# Altium integrated library Samtec_2,54_mm_Pitch_Socket_Strips.IntLib: 489 symbols (part 1 of 4)
Pins are listed as number, name and electrical type; pins without a type are passive.

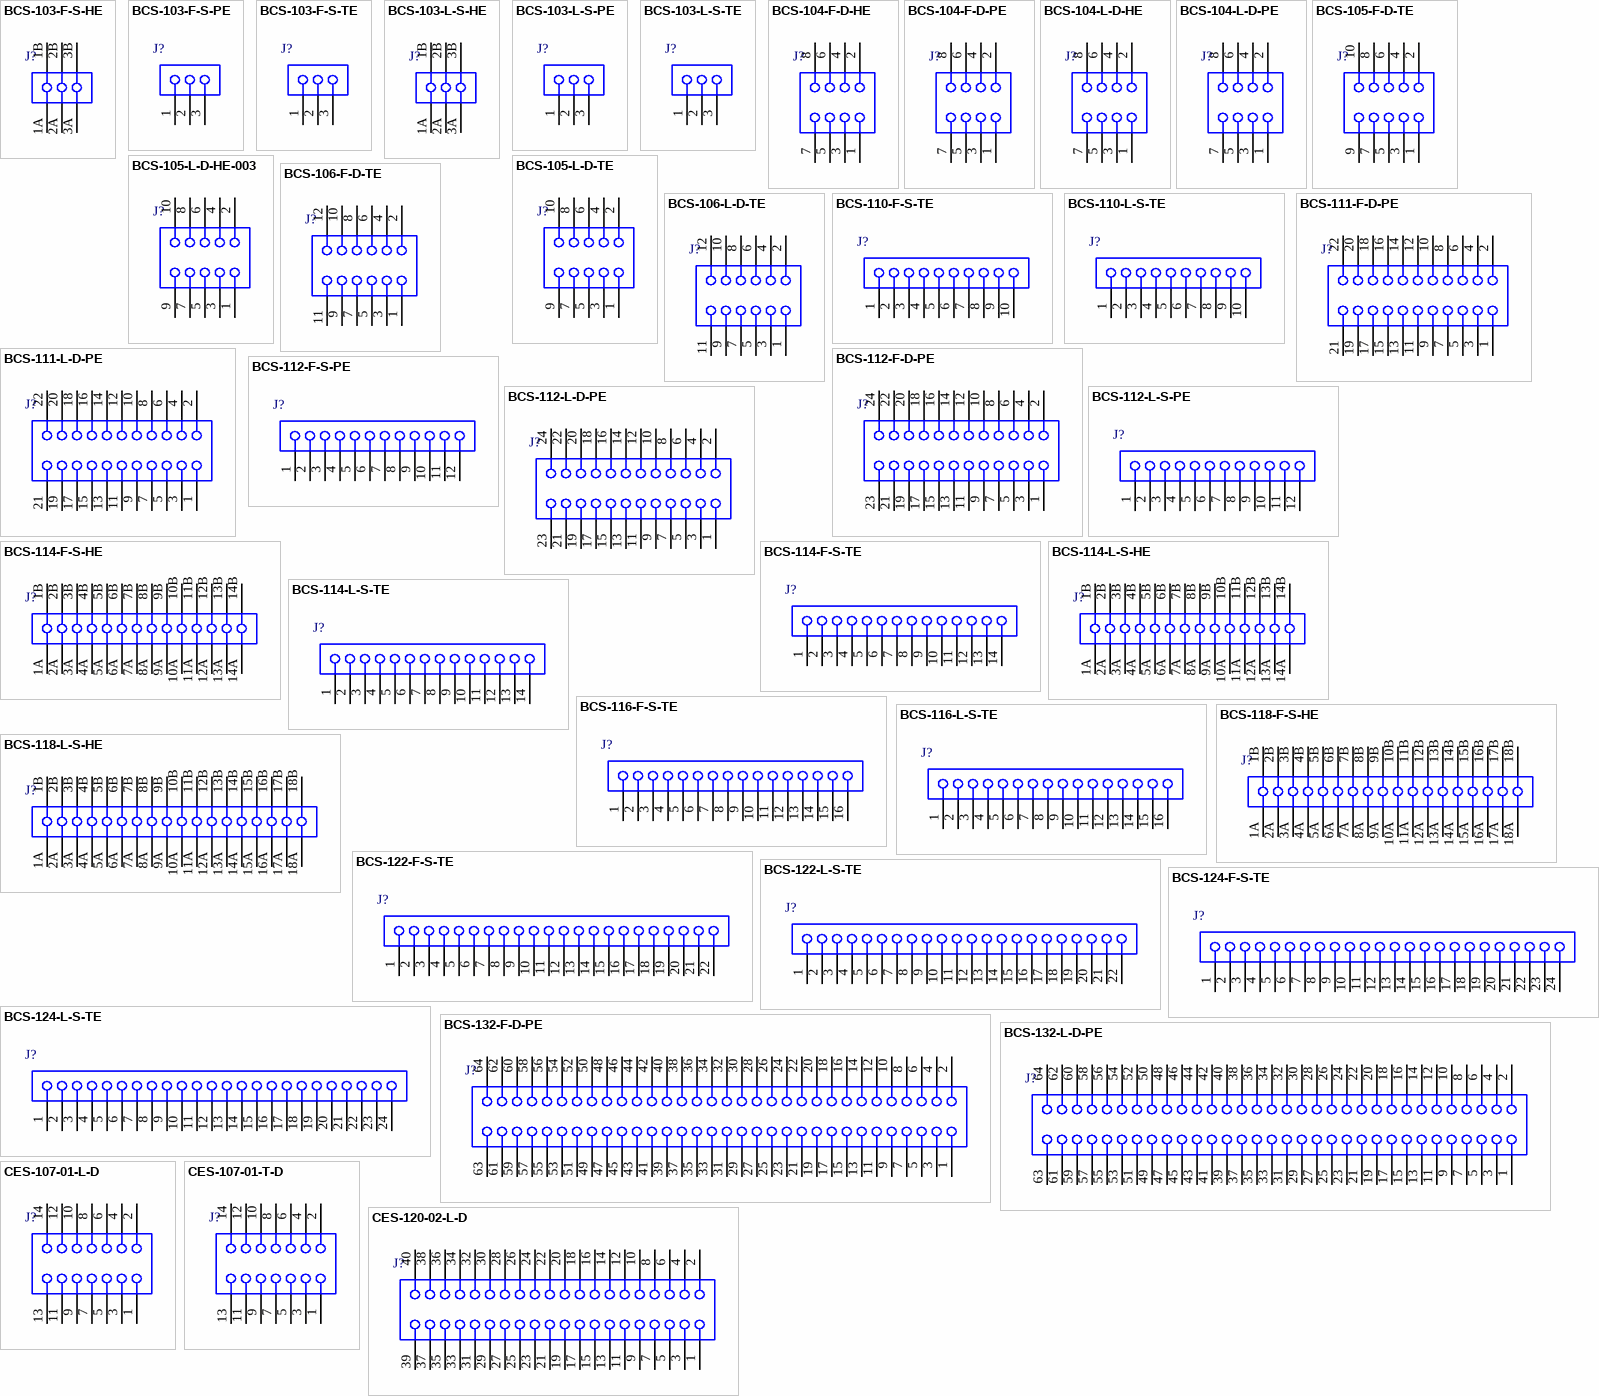
[diagram p0: symbols BCS-103-F-S-HE to CES-120-02-L-D]

## BCS-103-F-S-HE
designator J?
Tiger Claw(TM) Pass-Through Socket, Horizontal, -55 to 125 degC, 2.54 mm Pitch, 6-Pin, Female, RoHS; Manufacturer: Samtec; PartNumber: BCS-103-F-S-HE; Pitch: 2.54 mm; DatasheetVersion: F-214; PackageVersion: BV, 9/1991; PackageReference: BCS-103-X-S-HE; PackageDescription: Box Connector Socket Strip; Orientation: Horizontal; RoHS: True; Temperature Range: -55 to 125 degC; Mounting Technology: Through-hole; ComponentLink1Description: Manufacturer URL; ComponentLink1URL: http://www.samtec.com; ComponentLink2Description: Datasheet; ComponentLink2URL: http://www.samtec.com/documents/webfiles/pdf/BCS.PDF; ComponentLink3Description: Package Specification; ComponentLink3URL: http://www.samtec.com/documents/webfiles/cpdf/BCS-1XX-XXX-X-XX-XXX-MKT.pdf
footprint SMTC-BCS-103-X-S-HE (Box Connector Socket Strip, 2x3 Pins, Horizontal, 2.54mm Pitch, Female)
pins: 1A, 1B, 2A, 2B, 3A, 3B

## BCS-103-F-S-PE
designator J?
Tiger Claw(TM) Pass-Through Socket, Vertical, -55 to 125 degC, 2.54 mm Pitch, 3-Pin, Female, RoHS; Manufacturer: Samtec; PartNumber: BCS-103-F-S-PE; Pitch: 2.54 mm; DatasheetVersion: F-214; PackageVersion: BV, 9/1991; PackageReference: BCS-103-X-S-PE; PackageDescription: Box Connector Socket Strip; Orientation: Vertical; RoHS: True; Temperature Range: -55 to 125 degC; Mounting Technology: Through-hole; ComponentLink1Description: Manufacturer URL; ComponentLink1URL: http://www.samtec.com; ComponentLink2Description: Datasheet; ComponentLink2URL: http://www.samtec.com/documents/webfiles/pdf/BCS.PDF; ComponentLink3Description: Package Specification; ComponentLink3URL: http://www.samtec.com/documents/webfiles/cpdf/BCS-1XX-XXX-X-XX-XXX-MKT.pdf
footprint SMTC-BCS-103-X-S-PE (Box Connector Socket Strip, 3 Pins, Vertical, 2.54mm Pitch, Female)
pins: 1, 2, 3

## BCS-103-F-S-TE
designator J?
Tiger Claw(TM) Pass-Through Socket, Vertical, -55 to 125 degC, 2.54 mm Pitch, 3-Pin, Female, RoHS; Manufacturer: Samtec; PartNumber: BCS-103-F-S-TE; Pitch: 2.54 mm; DatasheetVersion: F-214; PackageVersion: BV, 9/1991; PackageReference: BCS-103-X-S-TE; PackageDescription: Box Connector Socket Strip; Orientation: Vertical; RoHS: True; Temperature Range: -55 to 125 degC; Mounting Technology: Through-hole; ComponentLink1Description: Manufacturer URL; ComponentLink1URL: http://www.samtec.com; ComponentLink2Description: Datasheet; ComponentLink2URL: http://www.samtec.com/documents/webfiles/pdf/BCS.PDF; ComponentLink3Description: Package Specification; ComponentLink3URL: http://www.samtec.com/documents/webfiles/cpdf/BCS-1XX-XXX-X-XX-XXX-MKT.pdf
footprint SMTC-BCS-103-X-S-TE (Box Connector Socket Strip, 1x3 Pins, Vertical, 2.54mm Pitch, Female)
pins: 1, 2, 3

## BCS-103-L-S-HE
designator J?
Tiger Claw(TM) Pass-Through Socket, Horizontal, -55 to 125 degC, 2.54 mm Pitch, 6-Pin, Female, RoHS; Manufacturer: Samtec; PartNumber: BCS-103-L-S-HE; Pitch: 2.54 mm; DatasheetVersion: F-214; PackageVersion: BV, 9/1991; PackageReference: BCS-103-X-S-HE; PackageDescription: Box Connector Socket Strip; Supplier 1: Digi-Key; Supplier Part Number 1: SAM1009-03-ND; Supplier 2: Newark; Supplier Part Number 2: 11P3211; Orientation: Horizontal; RoHS: True; Temperature Range: -55 to 125 degC; Mounting Technology: Through-hole; ComponentLink1Description: Manufacturer URL; ComponentLink1URL: http://www.samtec.com; ComponentLink2Description: Datasheet; ComponentLink2URL: http://www.samtec.com/documents/webfiles/pdf/BCS.PDF; ComponentLink3Description: Package Specification; ComponentLink3URL: http://www.samtec.com/documents/webfiles/cpdf/BCS-1XX-XXX-X-XX-XXX-MKT.pdf
footprint SMTC-BCS-103-X-S-HE (Box Connector Socket Strip, 2x3 Pins, Horizontal, 2.54mm Pitch, Female)
pins: 1A, 1B, 2A, 2B, 3A, 3B

## BCS-103-L-S-PE
designator J?
Tiger Claw(TM) Pass-Through Socket, Vertical, -55 to 125 degC, 2.54 mm Pitch, 3-Pin, Female, RoHS; Manufacturer: Samtec; PartNumber: BCS-103-L-S-PE; Pitch: 2.54 mm; DatasheetVersion: F-214; PackageVersion: BV, 9/1991; PackageReference: BCS-103-X-S-PE; PackageDescription: Box Connector Socket Strip; Supplier 1: Digi-Key; Supplier Part Number 1: SAM1010-03-ND; Supplier 2: Newark; Supplier Part Number 2: 11P3212; Orientation: Vertical; RoHS: True; Temperature Range: -55 to 125 degC; Mounting Technology: Through-hole; ComponentLink1Description: Manufacturer URL; ComponentLink1URL: http://www.samtec.com; ComponentLink2Description: Datasheet; ComponentLink2URL: http://www.samtec.com/documents/webfiles/pdf/BCS.PDF; ComponentLink3Description: Package Specification; ComponentLink3URL: http://www.samtec.com/documents/webfiles/cpdf/BCS-1XX-XXX-X-XX-XXX-MKT.pdf
footprint SMTC-BCS-103-X-S-PE (Box Connector Socket Strip, 3 Pins, Vertical, 2.54mm Pitch, Female)
pins: 1, 2, 3

## BCS-103-L-S-TE
designator J?
Tiger Claw(TM) Pass-Through Socket, Vertical, -55 to 125 degC, 2.54 mm Pitch, 3-Pin, Female, RoHS; Manufacturer: Samtec; PartNumber: BCS-103-L-S-TE; Pitch: 2.54 mm; DatasheetVersion: F-214; PackageVersion: BV, 9/1991; PackageReference: BCS-103-X-S-TE; PackageDescription: Box Connector Socket Strip; Supplier 1: Digi-Key; Supplier Part Number 1: SAM1011-03-ND; Supplier 2: Newark; Supplier Part Number 2: 11P3213; Orientation: Vertical; RoHS: True; Temperature Range: -55 to 125 degC; Mounting Technology: Through-hole; ComponentLink1Description: Manufacturer URL; ComponentLink1URL: http://www.samtec.com; ComponentLink2Description: Datasheet; ComponentLink2URL: http://www.samtec.com/documents/webfiles/pdf/BCS.PDF; ComponentLink3Description: Package Specification; ComponentLink3URL: http://www.samtec.com/documents/webfiles/cpdf/BCS-1XX-XXX-X-XX-XXX-MKT.pdf
footprint SMTC-BCS-103-X-S-TE (Box Connector Socket Strip, 1x3 Pins, Vertical, 2.54mm Pitch, Female)
pins: 1, 2, 3

## BCS-104-F-D-HE
designator J?
Tiger Claw(TM) Pass-Through Socket, Horizontal, -55 to 125 degC, 2.54 mm Pitch, 8-Pin, Female, RoHS; Manufacturer: Samtec; PartNumber: BCS-104-F-D-HE; Pitch: 2.54 mm; DatasheetVersion: F-214; PackageVersion: BV, 9/1991; PackageReference: BCS-104-X-D-HE; PackageDescription: Box Connector Socket Strip; Supplier 1: Newark; Supplier Part Number 1: 87P1759; Orientation: Horizontal; RoHS: True; Temperature Range: -55 to 125 degC; Mounting Technology: Through-hole; ComponentLink1Description: Manufacturer URL; ComponentLink1URL: http://www.samtec.com; ComponentLink2Description: Datasheet; ComponentLink2URL: http://www.samtec.com/documents/webfiles/pdf/BCS.PDF; ComponentLink3Description: Package Specification; ComponentLink3URL: http://www.samtec.com/documents/webfiles/cpdf/BCS-1XX-XXX-X-XX-XXX-MKT.pdf
footprint SMTC-BCS-104-X-D-HE (Box Connector Socket Strip, 2x4 Pins, Horizontal, 2.54mm Pitch, Female)
pins: 1, 2, 3, 4, 5, 6, 7, 8

## BCS-104-F-D-PE
designator J?
Tiger Claw(TM) Pass-Through Socket, Vertical, -55 to 125 degC, 2.54 mm Pitch, 8-Pin, Female, RoHS; Manufacturer: Samtec; PartNumber: BCS-104-F-D-PE; Pitch: 2.54 mm; DatasheetVersion: F-214; PackageVersion: BV, 9/1991; PackageReference: BCS-104-X-D-PE; PackageDescription: Box Connector Socket Strip; Supplier 1: Newark; Supplier Part Number 1: 87P1760; Orientation: Vertical; RoHS: True; Temperature Range: -55 to 125 degC; Mounting Technology: Through-hole; ComponentLink1Description: Manufacturer URL; ComponentLink1URL: http://www.samtec.com; ComponentLink2Description: Datasheet; ComponentLink2URL: http://www.samtec.com/documents/webfiles/pdf/BCS.PDF; ComponentLink3Description: Package Specification; ComponentLink3URL: http://www.samtec.com/documents/webfiles/cpdf/BCS-1XX-XXX-X-XX-XXX-MKT.pdf
footprint SMTC-BCS-104-X-D-PE (Box Connector Socket Strip, 2x4 Pins, Vertical, 2.54mm Pitch, Female)
pins: 1, 2, 3, 4, 5, 6, 7, 8

## BCS-104-L-D-HE
designator J?
Tiger Claw(TM) Pass-Through Socket, Horizontal, -55 to 125 degC, 2.54 mm Pitch, 8-Pin, Female, RoHS; Manufacturer: Samtec; PartNumber: BCS-104-L-D-HE; Pitch: 2.54 mm; DatasheetVersion: F-214; PackageVersion: BV, 9/1991; PackageReference: BCS-104-X-D-HE; PackageDescription: Box Connector Socket Strip; Supplier 1: Digi-Key; Supplier Part Number 1: SAM1006-04-ND; Supplier 2: Newark; Supplier Part Number 2: 11P3214; Orientation: Horizontal; RoHS: True; Temperature Range: -55 to 125 degC; Mounting Technology: Through-hole; ComponentLink1Description: Manufacturer URL; ComponentLink1URL: http://www.samtec.com; ComponentLink2Description: Datasheet; ComponentLink2URL: http://www.samtec.com/documents/webfiles/pdf/BCS.PDF; ComponentLink3Description: Package Specification; ComponentLink3URL: http://www.samtec.com/documents/webfiles/cpdf/BCS-1XX-XXX-X-XX-XXX-MKT.pdf
footprint SMTC-BCS-104-X-D-HE (Box Connector Socket Strip, 2x4 Pins, Horizontal, 2.54mm Pitch, Female)
pins: 1, 2, 3, 4, 5, 6, 7, 8

## BCS-104-L-D-PE
designator J?
Tiger Claw(TM) Pass-Through Socket, Vertical, -55 to 125 degC, 2.54 mm Pitch, 8-Pin, Female, RoHS; Manufacturer: Samtec; PartNumber: BCS-104-L-D-PE; Pitch: 2.54 mm; DatasheetVersion: F-214; PackageVersion: BV, 9/1991; PackageReference: BCS-104-X-D-PE; PackageDescription: Box Connector Socket Strip; Supplier 1: Digi-Key; Supplier Part Number 1: SAM1007-04-ND; Supplier 2: Newark; Supplier Part Number 2: 11P3215; Orientation: Vertical; RoHS: True; Temperature Range: -55 to 125 degC; Mounting Technology: Through-hole; ComponentLink1Description: Manufacturer URL; ComponentLink1URL: http://www.samtec.com; ComponentLink2Description: Datasheet; ComponentLink2URL: http://www.samtec.com/documents/webfiles/pdf/BCS.PDF; ComponentLink3Description: Package Specification; ComponentLink3URL: http://www.samtec.com/documents/webfiles/cpdf/BCS-1XX-XXX-X-XX-XXX-MKT.pdf
footprint SMTC-BCS-104-X-D-PE (Box Connector Socket Strip, 2x4 Pins, Vertical, 2.54mm Pitch, Female)
pins: 1, 2, 3, 4, 5, 6, 7, 8

## BCS-105-F-D-TE
designator J?
Tiger Claw(TM) Pass-Through Socket, Vertical, -55 to 125 degC, 2.54 mm Pitch, 10-Pin, Female, RoHS; Manufacturer: Samtec; PartNumber: BCS-105-F-D-TE; Pitch: 2.54 mm; DatasheetVersion: F-214; PackageVersion: BV, 9/1991; PackageReference: BCS-105-X-D-TE; PackageDescription: Box Connector Socket Strip; Supplier 1: Newark; Supplier Part Number 1: 87P1818; Orientation: Vertical; RoHS: True; Temperature Range: -55 to 125 degC; Mounting Technology: Through-hole; ComponentLink1Description: Manufacturer URL; ComponentLink1URL: http://www.samtec.com; ComponentLink2Description: Datasheet; ComponentLink2URL: http://www.samtec.com/documents/webfiles/pdf/BCS.PDF; ComponentLink3Description: Package Specification; ComponentLink3URL: http://www.samtec.com/documents/webfiles/cpdf/BCS-1XX-XXX-X-XX-XXX-MKT.pdf
footprint SMTC-BCS-105-X-D-TE (Box Connector Socket Strip, 2x5 Pins, Vertical, 2.54mm Pitch, Female)
pins: 1, 2, 3, 4, 5, 6, 7, 8, 9, 10

## BCS-105-L-D-HE-003
designator J?
Tiger Claw(TM) Pass-Through Socket, Horizontal, -55 to 125 degC, 2.54 mm Pitch, 10-Pin, Female, RoHS; Manufacturer: Samtec; PartNumber: BCS-105-L-D-HE-003; Pitch: 2.54 mm; DatasheetVersion: F-214; PackageVersion: BV, 9/1991; PackageReference: BCS-105-L-D-HE-003; PackageDescription: Box Connector Socket Strip; Orientation: Horizontal; RoHS: True; Temperature Range: -55 to 125 degC; Mounting Technology: Through-hole; ComponentLink1Description: Manufacturer URL; ComponentLink1URL: http://www.samtec.com; ComponentLink2Description: Datasheet; ComponentLink2URL: http://www.samtec.com/documents/webfiles/pdf/BCS.PDF; ComponentLink3Description: Package Specification; ComponentLink3URL: http://www.samtec.com/documents/webfiles/cpdf/BCS-1XX-XXX-X-XX-XXX-MKT.pdf
footprint SMTC-BCS-105-L-D-HE-003 (Box Connector Socket Strip, 2x5 Pins, Horizontal, 2.54mm Pitch, Female)
pins: 1, 2, 3, 4, 5, 6, 7, 8, 9, 10

## BCS-105-L-D-TE
designator J?
Tiger Claw(TM) Pass-Through Socket, Vertical, -55 to 125 degC, 2.54 mm Pitch, 10-Pin, Female, RoHS; Manufacturer: Samtec; PartNumber: BCS-105-L-D-TE; Pitch: 2.54 mm; DatasheetVersion: F-214; PackageVersion: BV, 9/1991; PackageReference: BCS-105-X-D-TE; PackageDescription: Box Connector Socket Strip; Supplier 1: Digi-Key; Supplier Part Number 1: SAM1008-05-ND; Supplier 2: Farnell; Supplier Part Number 2: 2308427; Supplier 3: Newark; Supplier Part Number 3: 11P3221; Supplier 4: Newark; Supplier Part Number 4: 69W8150; Orientation: Vertical; RoHS: True; Temperature Range: -55 to 125 degC; Mounting Technology: Through-hole; ComponentLink1Description: Manufacturer URL; ComponentLink1URL: http://www.samtec.com; ComponentLink2Description: Datasheet; ComponentLink2URL: http://www.samtec.com/documents/webfiles/pdf/BCS.PDF; ComponentLink3Description: Package Specification; ComponentLink3URL: http://www.samtec.com/documents/webfiles/cpdf/BCS-1XX-XXX-X-XX-XXX-MKT.pdf
footprint SMTC-BCS-105-X-D-TE (Box Connector Socket Strip, 2x5 Pins, Vertical, 2.54mm Pitch, Female)
pins: 1, 2, 3, 4, 5, 6, 7, 8, 9, 10

## BCS-106-F-D-TE
designator J?
Tiger Claw(TM) Pass-Through Socket, Vertical, -55 to 125 degC, 2.54 mm Pitch, 12-Pin, Female, RoHS; Manufacturer: Samtec; PartNumber: BCS-106-F-D-TE; Pitch: 2.54 mm; DatasheetVersion: F-214; PackageVersion: BV, 9/1991; PackageReference: BCS-106-X-D-TE; PackageDescription: Box Connector Socket Strip; Orientation: Vertical; RoHS: True; Temperature Range: -55 to 125 degC; Mounting Technology: Through-hole; ComponentLink1Description: Manufacturer URL; ComponentLink1URL: http://www.samtec.com; ComponentLink2Description: Datasheet; ComponentLink2URL: http://www.samtec.com/documents/webfiles/pdf/BCS.PDF; ComponentLink3Description: Package Specification; ComponentLink3URL: http://www.samtec.com/documents/webfiles/cpdf/BCS-1XX-XXX-X-XX-XXX-MKT.pdf
footprint SMTC-BCS-106-X-D-TE (Box Connector Socket Strip, 2x6 Pins, Vertical, 2.54mm Pitch, Female)
pins: 1, 2, 3, 4, 5, 6, 7, 8, 9, 10, 11, 12

## BCS-106-L-D-TE
designator J?
Tiger Claw(TM) Pass-Through Socket, Vertical, -55 to 125 degC, 2.54 mm Pitch, 12-Pin, Female, RoHS; Manufacturer: Samtec; PartNumber: BCS-106-L-D-TE; Pitch: 2.54 mm; DatasheetVersion: F-214; PackageVersion: BV, 9/1991; PackageReference: BCS-106-X-D-TE; PackageDescription: Box Connector Socket Strip; Supplier 1: Digi-Key; Supplier Part Number 1: SAM1008-06-ND; Supplier 2: Newark; Supplier Part Number 2: 11P3227; Orientation: Vertical; RoHS: True; Temperature Range: -55 to 125 degC; Mounting Technology: Through-hole; ComponentLink1Description: Manufacturer URL; ComponentLink1URL: http://www.samtec.com; ComponentLink2Description: Datasheet; ComponentLink2URL: http://www.samtec.com/documents/webfiles/pdf/BCS.PDF; ComponentLink3Description: Package Specification; ComponentLink3URL: http://www.samtec.com/documents/webfiles/cpdf/BCS-1XX-XXX-X-XX-XXX-MKT.pdf
footprint SMTC-BCS-106-X-D-TE (Box Connector Socket Strip, 2x6 Pins, Vertical, 2.54mm Pitch, Female)
pins: 1, 2, 3, 4, 5, 6, 7, 8, 9, 10, 11, 12

## BCS-110-F-S-TE
designator J?
Tiger Claw(TM) Pass-Through Socket, Vertical, -55 to 125 degC, 2.54 mm Pitch, 10-Pin, Female, RoHS; Manufacturer: Samtec; PartNumber: BCS-110-F-S-TE; Pitch: 2.54 mm; DatasheetVersion: F-214; PackageVersion: BV, 9/1991; PackageReference: BCS-110-X-S-TE; PackageDescription: Box Connector Socket Strip; Orientation: Vertical; RoHS: True; Temperature Range: -55 to 125 degC; Mounting Technology: Through-hole; ComponentLink1Description: Manufacturer URL; ComponentLink1URL: http://www.samtec.com; ComponentLink2Description: Datasheet; ComponentLink2URL: http://www.samtec.com/documents/webfiles/pdf/BCS.PDF; ComponentLink3Description: Package Specification; ComponentLink3URL: http://www.samtec.com/documents/webfiles/cpdf/BCS-1XX-XXX-X-XX-XXX-MKT.pdf
footprint SMTC-BCS-110-X-S-TE (Box Connector Socket Strip, 1x10 Pins, Vertical, 2.54mm Pitch, Female)
pins: 1, 2, 3, 4, 5, 6, 7, 8, 9, 10

## BCS-110-L-S-TE
designator J?
Tiger Claw(TM) Pass-Through Socket, Vertical, -55 to 125 degC, 2.54 mm Pitch, 10-Pin, Female, RoHS; Manufacturer: Samtec; PartNumber: BCS-110-L-S-TE; Pitch: 2.54 mm; DatasheetVersion: F-214; PackageVersion: BV, 9/1991; PackageReference: BCS-110-X-S-TE; PackageDescription: Box Connector Socket Strip; Supplier 1: Digi-Key; Supplier Part Number 1: SAM1011-10-ND; Supplier 2: Farnell; Supplier Part Number 2: 1667477; Supplier 3: Newark; Supplier Part Number 3: 11P3254; Orientation: Vertical; RoHS: True; Temperature Range: -55 to 125 degC; Mounting Technology: Through-hole; ComponentLink1Description: Manufacturer URL; ComponentLink1URL: http://www.samtec.com; ComponentLink2Description: Datasheet; ComponentLink2URL: http://www.samtec.com/documents/webfiles/pdf/BCS.PDF; ComponentLink3Description: Package Specification; ComponentLink3URL: http://www.samtec.com/documents/webfiles/cpdf/BCS-1XX-XXX-X-XX-XXX-MKT.pdf
footprint SMTC-BCS-110-X-S-TE (Box Connector Socket Strip, 1x10 Pins, Vertical, 2.54mm Pitch, Female)
pins: 1, 2, 3, 4, 5, 6, 7, 8, 9, 10

## BCS-111-F-D-PE
designator J?
Tiger Claw(TM) Pass-Through Socket, Vertical, -55 to 125 degC, 2.54 mm Pitch, 22-Pin, Female, RoHS; Manufacturer: Samtec; PartNumber: BCS-111-F-D-PE; Pitch: 2.54 mm; DatasheetVersion: F-214; PackageVersion: BV, 9/1991; PackageReference: BCS-111-X-D-PE; PackageDescription: Box Connector Socket Strip; Orientation: Vertical; RoHS: True; Temperature Range: -55 to 125 degC; Mounting Technology: Through-hole; ComponentLink1Description: Manufacturer URL; ComponentLink1URL: http://www.samtec.com; ComponentLink2Description: Datasheet; ComponentLink2URL: http://www.samtec.com/documents/webfiles/pdf/BCS.PDF; ComponentLink3Description: Package Specification; ComponentLink3URL: http://www.samtec.com/documents/webfiles/cpdf/BCS-1XX-XXX-X-XX-XXX-MKT.pdf
footprint SMTC-BCS-111-X-D-PE (Box Connector Socket Strip, 2x11 Pins, Vertical, 2.54mm Pitch, Female)
pins: 1, 2, 3, 4, 5, 6, 7, 8, 9, 10, 11, 12, 13, 14, 15, 16, 17, 18, 19, 20, 21, 22

## BCS-111-L-D-PE
designator J?
Tiger Claw(TM) Pass-Through Socket, Vertical, -55 to 125 degC, 2.54 mm Pitch, 22-Pin, Female, RoHS; Manufacturer: Samtec; PartNumber: BCS-111-L-D-PE; Pitch: 2.54 mm; DatasheetVersion: F-214; PackageVersion: BV, 9/1991; PackageReference: BCS-111-X-D-PE; PackageDescription: Box Connector Socket Strip; Supplier 1: Digi-Key; Supplier Part Number 1: SAM1007-11-ND; Supplier 2: Newark; Supplier Part Number 2: 11P3256; Orientation: Vertical; RoHS: True; Temperature Range: -55 to 125 degC; Mounting Technology: Through-hole; ComponentLink1Description: Manufacturer URL; ComponentLink1URL: http://www.samtec.com; ComponentLink2Description: Datasheet; ComponentLink2URL: http://www.samtec.com/documents/webfiles/pdf/BCS.PDF; ComponentLink3Description: Package Specification; ComponentLink3URL: http://www.samtec.com/documents/webfiles/cpdf/BCS-1XX-XXX-X-XX-XXX-MKT.pdf
footprint SMTC-BCS-111-X-D-PE (Box Connector Socket Strip, 2x11 Pins, Vertical, 2.54mm Pitch, Female)
pins: 1, 2, 3, 4, 5, 6, 7, 8, 9, 10, 11, 12, 13, 14, 15, 16, 17, 18, 19, 20, 21, 22

## BCS-112-F-D-PE
designator J?
Tiger Claw(TM) Pass-Through Socket, Vertical, -55 to 125 degC, 2.54 mm Pitch, 24-Pin, Female, RoHS; Manufacturer: Samtec; PartNumber: BCS-112-F-D-PE; Pitch: 2.54 mm; DatasheetVersion: F-214; PackageVersion: BV, 9/1991; PackageReference: BCS-112-X-D-PE; PackageDescription: Box Connector Socket Strip; Orientation: Vertical; RoHS: True; Temperature Range: -55 to 125 degC; Mounting Technology: Through-hole; ComponentLink1Description: Manufacturer URL; ComponentLink1URL: http://www.samtec.com; ComponentLink2Description: Datasheet; ComponentLink2URL: http://www.samtec.com/documents/webfiles/pdf/BCS.PDF; ComponentLink3Description: Package Specification; ComponentLink3URL: http://www.samtec.com/documents/webfiles/cpdf/BCS-1XX-XXX-X-XX-XXX-MKT.pdf
footprint SMTC-BCS-112-X-D-PE (Box Connector Socket Strip, 2x12 Pins, Vertical, 2.54mm Pitch, Female)
pins: 1, 2, 3, 4, 5, 6, 7, 8, 9, 10, 11, 12, 13, 14, 15, 16, 17, 18, 19, 20, 21, 22, 23, 24

## BCS-112-F-S-PE
designator J?
Tiger Claw(TM) Pass-Through Socket, Vertical, -55 to 125 degC, 2.54 mm Pitch, 12-Pin, Female, RoHS; Manufacturer: Samtec; PartNumber: BCS-112-F-S-PE; Pitch: 2.54 mm; DatasheetVersion: F-214; PackageVersion: BV, 9/1991; PackageReference: BCS-112-X-S-PE; PackageDescription: Box Connector Socket Strip; Orientation: Vertical; RoHS: True; Temperature Range: -55 to 125 degC; Mounting Technology: Through-hole; ComponentLink1Description: Manufacturer URL; ComponentLink1URL: http://www.samtec.com; ComponentLink2Description: Datasheet; ComponentLink2URL: http://www.samtec.com/documents/webfiles/pdf/BCS.PDF; ComponentLink3Description: Package Specification; ComponentLink3URL: http://www.samtec.com/documents/webfiles/cpdf/BCS-1XX-XXX-X-XX-XXX-MKT.pdf
footprint SMTC-BCS-112-X-S-PE (Box Connector Socket Strip, 12 Pins, Vertical, 2.54mm Pitch, Female)
pins: 1, 2, 3, 4, 5, 6, 7, 8, 9, 10, 11, 12

## BCS-112-L-D-PE
designator J?
Tiger Claw(TM) Pass-Through Socket, Vertical, -55 to 125 degC, 2.54 mm Pitch, 24-Pin, Female, RoHS; Manufacturer: Samtec; PartNumber: BCS-112-L-D-PE; Pitch: 2.54 mm; DatasheetVersion: F-214; PackageVersion: BV, 9/1991; PackageReference: BCS-112-X-D-PE; PackageDescription: Box Connector Socket Strip; Supplier 1: Digi-Key; Supplier Part Number 1: SAM1007-12-ND; Supplier 2: Newark; Supplier Part Number 2: 11P3261; Orientation: Vertical; RoHS: True; Temperature Range: -55 to 125 degC; Mounting Technology: Through-hole; ComponentLink1Description: Manufacturer URL; ComponentLink1URL: http://www.samtec.com; ComponentLink2Description: Datasheet; ComponentLink2URL: http://www.samtec.com/documents/webfiles/pdf/BCS.PDF; ComponentLink3Description: Package Specification; ComponentLink3URL: http://www.samtec.com/documents/webfiles/cpdf/BCS-1XX-XXX-X-XX-XXX-MKT.pdf
footprint SMTC-BCS-112-X-D-PE (Box Connector Socket Strip, 2x12 Pins, Vertical, 2.54mm Pitch, Female)
pins: 1, 2, 3, 4, 5, 6, 7, 8, 9, 10, 11, 12, 13, 14, 15, 16, 17, 18, 19, 20, 21, 22, 23, 24

## BCS-112-L-S-PE
designator J?
Tiger Claw(TM) Pass-Through Socket, Vertical, -55 to 125 degC, 2.54 mm Pitch, 12-Pin, Female, RoHS; Manufacturer: Samtec; PartNumber: BCS-112-L-S-PE; Pitch: 2.54 mm; DatasheetVersion: F-214; PackageVersion: BV, 9/1991; PackageReference: BCS-112-X-S-PE; PackageDescription: Box Connector Socket Strip; Supplier 1: Digi-Key; Supplier Part Number 1: SAM1010-12-ND; Supplier 2: Newark; Supplier Part Number 2: 11P3264; Orientation: Vertical; RoHS: True; Temperature Range: -55 to 125 degC; Mounting Technology: Through-hole; ComponentLink1Description: Manufacturer URL; ComponentLink1URL: http://www.samtec.com; ComponentLink2Description: Datasheet; ComponentLink2URL: http://www.samtec.com/documents/webfiles/pdf/BCS.PDF; ComponentLink3Description: Package Specification; ComponentLink3URL: http://www.samtec.com/documents/webfiles/cpdf/BCS-1XX-XXX-X-XX-XXX-MKT.pdf
footprint SMTC-BCS-112-X-S-PE (Box Connector Socket Strip, 12 Pins, Vertical, 2.54mm Pitch, Female)
pins: 1, 2, 3, 4, 5, 6, 7, 8, 9, 10, 11, 12

## BCS-114-F-S-HE
designator J?
Tiger Claw(TM) Pass-Through Socket, Horizontal, -55 to 125 degC, 2.54 mm Pitch, 28-Pin, Female, RoHS; Manufacturer: Samtec; PartNumber: BCS-114-F-S-HE; Pitch: 2.54 mm; DatasheetVersion: F-214; PackageVersion: BV, 9/1991; PackageReference: BCS-114-X-S-HE; PackageDescription: Box Connector Socket Strip; Orientation: Horizontal; RoHS: True; Temperature Range: -55 to 125 degC; Mounting Technology: Through-hole; ComponentLink1Description: Manufacturer URL; ComponentLink1URL: http://www.samtec.com; ComponentLink2Description: Datasheet; ComponentLink2URL: http://www.samtec.com/documents/webfiles/pdf/BCS.PDF; ComponentLink3Description: Package Specification; ComponentLink3URL: http://www.samtec.com/documents/webfiles/cpdf/BCS-1XX-XXX-X-XX-XXX-MKT.pdf
footprint SMTC-BCS-114-X-S-HE (Box Connector Socket Strip, 2x14 Pins, Horizontal, 2.54mm Pitch, Female)
pins: 1A, 1B, 2A, 2B, 3A, 3B, 4A, 4B, 5A, 5B, 6A, 6B, 7A, 7B, 8A, 8B, 9A, 9B, 10A, 10B, 11A, 11B, 12A, 12B, 13A, 13B, 14A, 14B

## BCS-114-F-S-TE
designator J?
Tiger Claw(TM) Pass-Through Socket, Vertical, -55 to 125 degC, 2.54 mm Pitch, 14-Pin, Female, RoHS; Manufacturer: Samtec; PartNumber: BCS-114-F-S-TE; Pitch: 2.54 mm; DatasheetVersion: F-214; PackageVersion: BV, 9/1991; PackageReference: BCS-114-X-S-TE; PackageDescription: Box Connector Socket Strip; Orientation: Vertical; RoHS: True; Temperature Range: -55 to 125 degC; Mounting Technology: Through-hole; ComponentLink1Description: Manufacturer URL; ComponentLink1URL: http://www.samtec.com; ComponentLink2Description: Datasheet; ComponentLink2URL: http://www.samtec.com/documents/webfiles/pdf/BCS.PDF; ComponentLink3Description: Package Specification; ComponentLink3URL: http://www.samtec.com/documents/webfiles/cpdf/BCS-1XX-XXX-X-XX-XXX-MKT.pdf
footprint SMTC-BCS-114-X-S-TE (Box Connector Socket Strip, 1x14 Pins, Vertical, 2.54mm Pitch, Female)
pins: 1, 2, 3, 4, 5, 6, 7, 8, 9, 10, 11, 12, 13, 14

## BCS-114-L-S-HE
designator J?
Tiger Claw(TM) Pass-Through Socket, Horizontal, -55 to 125 degC, 2.54 mm Pitch, 28-Pin, Female, RoHS; Manufacturer: Samtec; PartNumber: BCS-114-L-S-HE; Pitch: 2.54 mm; DatasheetVersion: F-214; PackageVersion: BV, 9/1991; PackageReference: BCS-114-X-S-HE; PackageDescription: Box Connector Socket Strip; Supplier 1: Digi-Key; Supplier Part Number 1: SAM1009-14-ND; Supplier 2: Farnell; Supplier Part Number 2: 1667480; Supplier 3: Newark; Supplier Part Number 3: 11P3274; Orientation: Horizontal; RoHS: True; Temperature Range: -55 to 125 degC; Mounting Technology: Through-hole; ComponentLink1Description: Manufacturer URL; ComponentLink1URL: http://www.samtec.com; ComponentLink2Description: Datasheet; ComponentLink2URL: http://www.samtec.com/documents/webfiles/pdf/BCS.PDF; ComponentLink3Description: Package Specification; ComponentLink3URL: http://www.samtec.com/documents/webfiles/cpdf/BCS-1XX-XXX-X-XX-XXX-MKT.pdf
footprint SMTC-BCS-114-X-S-HE (Box Connector Socket Strip, 2x14 Pins, Horizontal, 2.54mm Pitch, Female)
pins: 1A, 1B, 2A, 2B, 3A, 3B, 4A, 4B, 5A, 5B, 6A, 6B, 7A, 7B, 8A, 8B, 9A, 9B, 10A, 10B, 11A, 11B, 12A, 12B, 13A, 13B, 14A, 14B

## BCS-114-L-S-TE
designator J?
Tiger Claw(TM) Pass-Through Socket, Vertical, -55 to 125 degC, 2.54 mm Pitch, 14-Pin, Female, RoHS; Manufacturer: Samtec; PartNumber: BCS-114-L-S-TE; Pitch: 2.54 mm; DatasheetVersion: F-214; PackageVersion: BV, 9/1991; PackageReference: BCS-114-X-S-TE; PackageDescription: Box Connector Socket Strip; Supplier 1: Digi-Key; Supplier Part Number 1: SAM1011-14-ND; Supplier 2: Farnell; Supplier Part Number 2: 1667481; Supplier 3: Newark; Supplier Part Number 3: 11P3276; Orientation: Vertical; RoHS: True; Temperature Range: -55 to 125 degC; Mounting Technology: Through-hole; ComponentLink1Description: Manufacturer URL; ComponentLink1URL: http://www.samtec.com; ComponentLink2Description: Datasheet; ComponentLink2URL: http://www.samtec.com/documents/webfiles/pdf/BCS.PDF; ComponentLink3Description: Package Specification; ComponentLink3URL: http://www.samtec.com/documents/webfiles/cpdf/BCS-1XX-XXX-X-XX-XXX-MKT.pdf
footprint SMTC-BCS-114-X-S-TE (Box Connector Socket Strip, 1x14 Pins, Vertical, 2.54mm Pitch, Female)
pins: 1, 2, 3, 4, 5, 6, 7, 8, 9, 10, 11, 12, 13, 14

## BCS-116-F-S-TE
designator J?
Tiger Claw(TM) Pass-Through Socket, Vertical, -55 to 125 degC, 2.54 mm Pitch, 16-Pin, Female, RoHS; Manufacturer: Samtec; PartNumber: BCS-116-F-S-TE; Pitch: 2.54 mm; DatasheetVersion: F-214; PackageVersion: BV, 9/1991; PackageReference: BCS-116-X-S-TE; PackageDescription: Box Connector Socket Strip; Orientation: Vertical; RoHS: True; Temperature Range: -55 to 125 degC; Mounting Technology: Through-hole; ComponentLink1Description: Manufacturer URL; ComponentLink1URL: http://www.samtec.com; ComponentLink2Description: Datasheet; ComponentLink2URL: http://www.samtec.com/documents/webfiles/pdf/BCS.PDF; ComponentLink3Description: Package Specification; ComponentLink3URL: http://www.samtec.com/documents/webfiles/cpdf/BCS-1XX-XXX-X-XX-XXX-MKT.pdf
footprint SMTC-BCS-116-X-S-TE (Box Connector Socket Strip, 1x16 Pins, Vertical, 2.54mm Pitch, Female)
pins: 1, 2, 3, 4, 5, 6, 7, 8, 9, 10, 11, 12, 13, 14, 15, 16

## BCS-116-L-S-TE
designator J?
Tiger Claw(TM) Pass-Through Socket, Vertical, -55 to 125 degC, 2.54 mm Pitch, 16-Pin, Female, RoHS; Manufacturer: Samtec; PartNumber: BCS-116-L-S-TE; Pitch: 2.54 mm; DatasheetVersion: F-214; PackageVersion: BV, 9/1991; PackageReference: BCS-116-X-S-TE; PackageDescription: Box Connector Socket Strip; Supplier 1: Digi-Key; Supplier Part Number 1: SAM1011-16-ND; Supplier 2: Farnell; Supplier Part Number 2: 1667483; Supplier 3: Newark; Supplier Part Number 3: 11P3287; Orientation: Vertical; RoHS: True; Temperature Range: -55 to 125 degC; Mounting Technology: Through-hole; ComponentLink1Description: Manufacturer URL; ComponentLink1URL: http://www.samtec.com; ComponentLink2Description: Datasheet; ComponentLink2URL: http://www.samtec.com/documents/webfiles/pdf/BCS.PDF; ComponentLink3Description: Package Specification; ComponentLink3URL: http://www.samtec.com/documents/webfiles/cpdf/BCS-1XX-XXX-X-XX-XXX-MKT.pdf
footprint SMTC-BCS-116-X-S-TE (Box Connector Socket Strip, 1x16 Pins, Vertical, 2.54mm Pitch, Female)
pins: 1, 2, 3, 4, 5, 6, 7, 8, 9, 10, 11, 12, 13, 14, 15, 16

## BCS-118-F-S-HE
designator J?
Tiger Claw(TM) Pass-Through Socket, Horizontal, -55 to 125 degC, 2.54 mm Pitch, 36-Pin, Female, RoHS; Manufacturer: Samtec; PartNumber: BCS-118-F-S-HE; Pitch: 2.54 mm; DatasheetVersion: F-214; PackageVersion: BV, 9/1991; PackageReference: BCS-118-X-S-HE; PackageDescription: Box Connector Socket Strip; Orientation: Horizontal; RoHS: True; Temperature Range: -55 to 125 degC; Mounting Technology: Through-hole; ComponentLink1Description: Manufacturer URL; ComponentLink1URL: http://www.samtec.com; ComponentLink2Description: Datasheet; ComponentLink2URL: http://www.samtec.com/documents/webfiles/pdf/BCS.PDF; ComponentLink3Description: Package Specification; ComponentLink3URL: http://www.samtec.com/documents/webfiles/cpdf/BCS-1XX-XXX-X-XX-XXX-MKT.pdf
footprint SMTC-BCS-118-X-S-HE (Box Connector Socket Strip, 2x18 Pins, Horizontal, 2.54mm Pitch, Female)
pins: 1A, 1B, 2A, 2B, 3A, 3B, 4A, 4B, 5A, 5B, 6A, 6B, 7A, 7B, 8A, 8B, 9A, 9B, 10A, 10B, 11A, 11B, 12A, 12B, 13A, 13B, 14A, 14B, 15A, 15B, 16A, 16B, 17A, 17B, 18A, 18B

## BCS-118-L-S-HE
designator J?
Tiger Claw(TM) Pass-Through Socket, Horizontal, -55 to 125 degC, 2.54 mm Pitch, 36-Pin, Female, RoHS; Manufacturer: Samtec; PartNumber: BCS-118-L-S-HE; Pitch: 2.54 mm; DatasheetVersion: F-214; PackageVersion: BV, 9/1991; PackageReference: BCS-118-X-S-HE; PackageDescription: Box Connector Socket Strip; Supplier 1: Digi-Key; Supplier Part Number 1: SAM1009-18-ND; Supplier 2: Farnell; Supplier Part Number 2: 1667484; Supplier 3: Newark; Supplier Part Number 3: 11P3297; Orientation: Horizontal; RoHS: True; Temperature Range: -55 to 125 degC; Mounting Technology: Through-hole; ComponentLink1Description: Manufacturer URL; ComponentLink1URL: http://www.samtec.com; ComponentLink2Description: Datasheet; ComponentLink2URL: http://www.samtec.com/documents/webfiles/pdf/BCS.PDF; ComponentLink3Description: Package Specification; ComponentLink3URL: http://www.samtec.com/documents/webfiles/cpdf/BCS-1XX-XXX-X-XX-XXX-MKT.pdf
footprint SMTC-BCS-118-X-S-HE (Box Connector Socket Strip, 2x18 Pins, Horizontal, 2.54mm Pitch, Female)
pins: 1A, 1B, 2A, 2B, 3A, 3B, 4A, 4B, 5A, 5B, 6A, 6B, 7A, 7B, 8A, 8B, 9A, 9B, 10A, 10B, 11A, 11B, 12A, 12B, 13A, 13B, 14A, 14B, 15A, 15B, 16A, 16B, 17A, 17B, 18A, 18B
